# Altium footprint library 3D封装库.PcbLib: 716 footprints (part 18 of 45)
Each footprint in its own frame and in the unit in brackets; x right, y up, seen from the top. Pads: shape width x height; smd on the part's side, far side on the other; paste and mask are expansions set on the pad; w line width, h text height; cw(c..) or ccw(c..) is an arc to the next point about the centre after c.
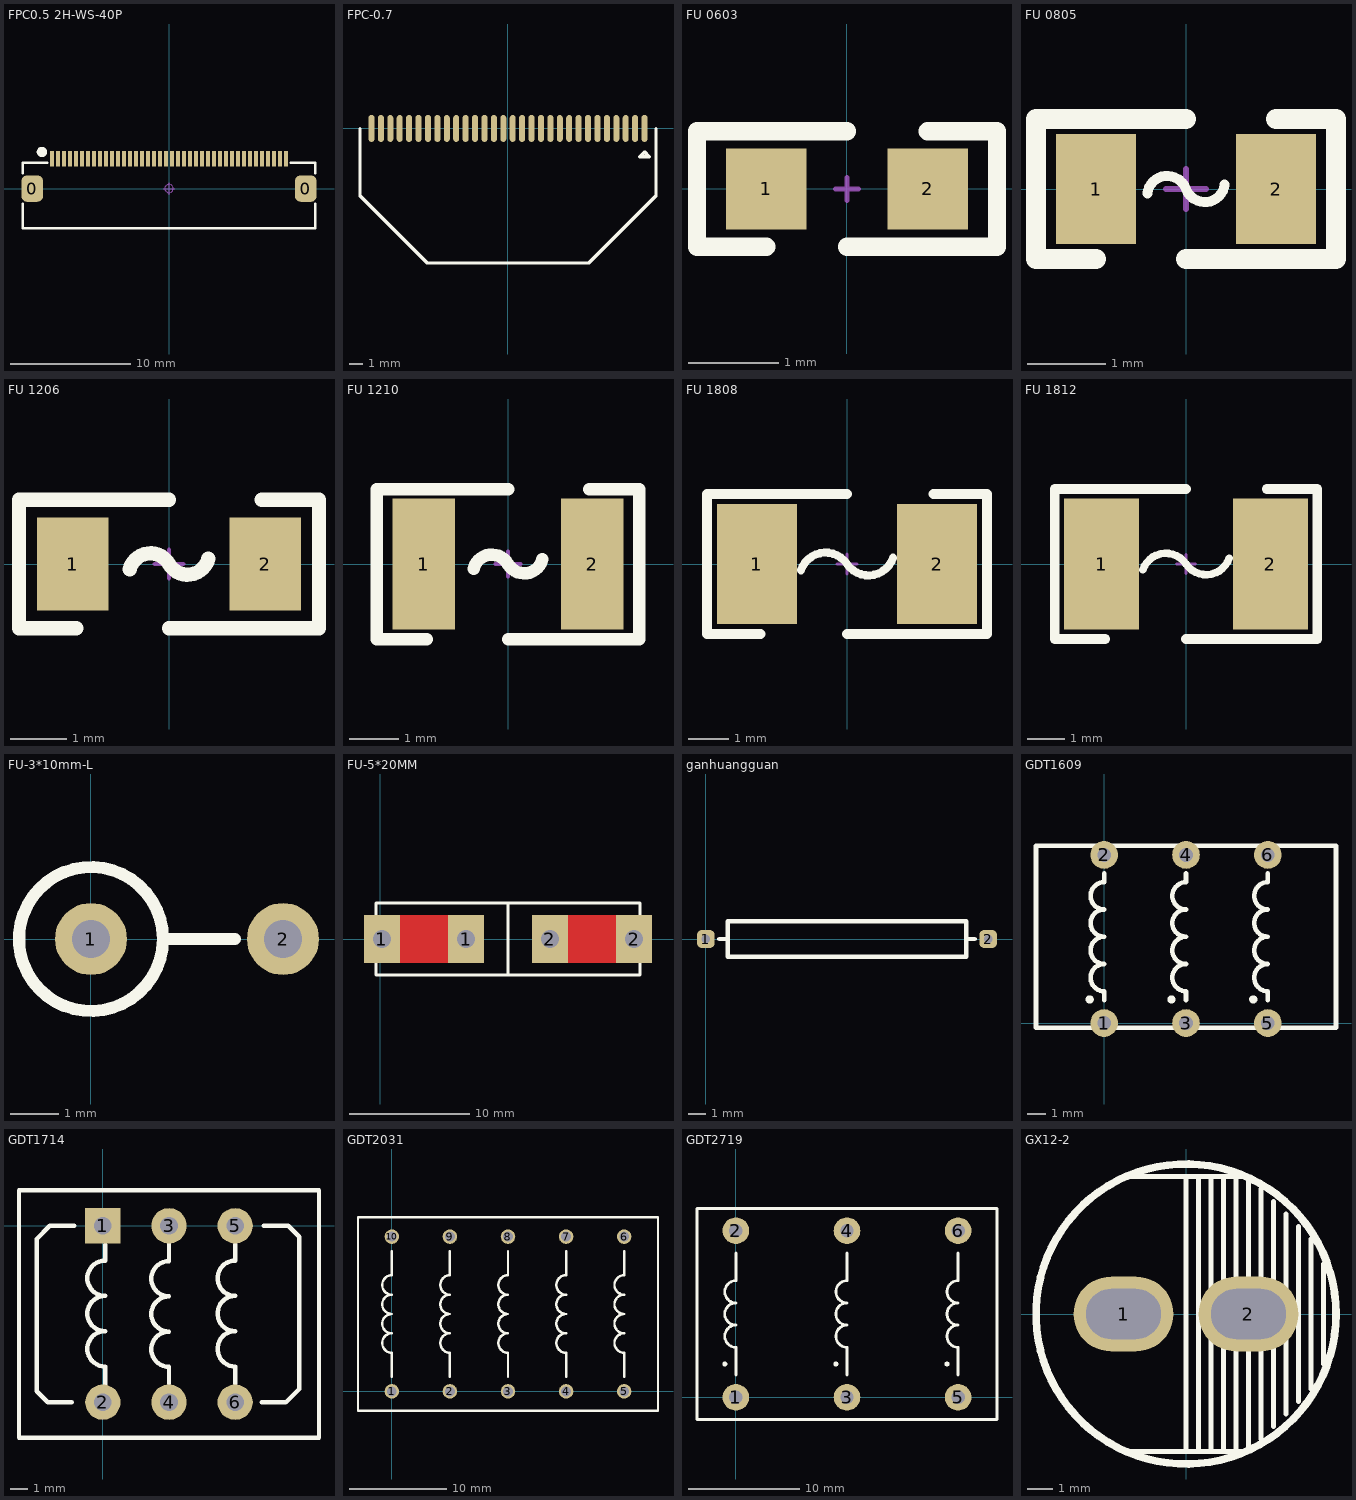
[diagram p17: the footprints below, top view; thin cyan lines are the x and y axes]

## FPC0.5 2H-WS-40P [mm] "长：24.2mm，宽：5.2mm，高：2mm"
pads (42):
  rrect50% 1.8x2.2 smd: 0(-11.4,0) 0(11.4,0)
  rect 0.3x1.3 smd: 1(-9.75,2.497) 2(-9.25,2.497) 3(-8.75,2.497) 4(-8.25,2.497) 5(-7.75,2.497) 6(-7.25,2.497) 7(-6.75,2.497) 8(-6.25,2.497) 9(-5.75,2.497) 10(-5.25,2.497) 11(-4.75,2.497) 12(-4.25,2.497) 13(-3.75,2.497) 14(-3.25,2.497) 15(-2.75,2.497) 16(-2.25,2.497) 17(-1.75,2.497) 18(-1.25,2.497) 19(-0.75,2.497) 20(-0.25,2.497) 21(0.25,2.497) 22(0.75,2.497) 23(1.25,2.497) 24(1.75,2.497) 25(2.25,2.497) 26(2.75,2.497) 27(3.25,2.497) 28(3.75,2.497) 29(4.25,2.497) 30(4.75,2.497) 31(5.25,2.497) 32(5.75,2.497) 33(6.25,2.497) 34(6.75,2.497) 35(7.25,2.497) 36(7.75,2.497) 37(8.25,2.497) 38(8.75,2.497) 39(9.25,2.497) 40(9.75,2.497)
Top Overlay:
  circle w0.5: c-10.594,3.048 r0.18
  lines w0.2: -12.175,-1.27 -12.175,-3.302 12.175,-3.302 12.175,-1.27 ; -12.175,1.27 -12.175,2.159 -10.143,2.159 ; 10.143,2.159 12.175,2.159 12.175,1.27
Mechanical 15:
  circle w0.05: c0,0 r0.35
  lines w0.05: -0.5,0 0.5,0 ; 0,-0.5 0,0.5
3D body "FPC0.5 2H-S-W-40P.STEP": height 2, standoff -0.01, extent -12.1,-3.15 12.1,2.85

## FPC-0.7 [mm] "0.96OLED"
pads (30):
  oval 0.45x2 smd: 1(10.15,0) 2(9.45,0) 3(8.75,0) 4(8.05,0) 5(7.35,0) 6(6.65,0) 7(5.95,0) 8(5.25,0) 9(4.55,0) 10(3.85,0) 11(3.15,0) 12(2.45,0) 13(1.75,0) 14(1.05,0) 15(0.35,0) 16(-0.35,0) 17(-1.05,0) 18(-1.75,0) 19(-2.45,0) 20(-3.15,0) 21(-3.85,0) 22(-4.55,0) 23(-5.25,0) 24(-5.95,0) 25(-6.65,0) 26(-7.35,0) 27(-8.05,0) 28(-8.75,0) 29(-9.45,0) 30(-10.15,0)
Top Overlay:
  lines w0.254: -11,0 -11,-5 -6,-10 6,-10 11,-5 11,0 ; 9.8,-2.1 10.5,-2.1 10.15,-1.75 9.8,-2.1

## FU 0603 [mil] "贴片保险丝"
pads (2):
  rect 35x35 smd: 1(-35,0) 2(35,0)
Top Overlay:
  lines w8: -35,-25 -65,-25 -65,25 -40,25 0,25 ; 0,-25 40,-25 65,-25 65,25 35,25
Mechanical 15:
  lines w2: -5,0 5,0 ; 0,-5 0,0 0,5
3D body "FU 0603.STEP": height 20.47, standoff 0, extent -31.5,-16.14 31.5,16.14

## FU 0805 [mil] "贴片保险丝"
pads (2):
  rect 40x55 smd: 1(-45,0) 2(45,0)
Top Overlay:
  lines w5: -19.33,-2.28 cw(c-9.4,-3.42) 0,0 ccw(c9.4,3.42) 19.33,2.28
  lines w10: -45,-35 -75,-35 -75,35 -45,35 0,35 ; 0,-35 60,-35 ; 45,35 75,35 75,-35 50,-35
Mechanical 15:
  lines w3: -10,0 10,0 ; 0,-10 0,10
3D body "FU 0805.STEP": height 20.47, standoff 0, extent -39.37,-24.02 39.37,24.02

## FU 1206 [mil] "贴片保险丝"
pads (2):
  rect 50x65 smd: 1(-67.5,0) 2(67.5,0)
Top Overlay:
  lines w10: -90,45 0,45 ; -65,-45 -105,-45 -105,45 -65,45 ; -27.48,-3.62 cw(c-12.99,-7.5) 0,0 ccw(c12.99,7.5) 27.48,3.62 ; 0,-45 90,-45 ; 65,-45 105,-45 105,45 65,45
Mechanical 15:
  lines w3: -10,0 10,0 ; 0,-10 0,10
3D body "FU 01206.STEP": height 34.25, standoff 0, extent -62.99,-31.89 62.99,31.89

## FU 1210 [mil] "贴片保险丝"
pads (2):
  rect 50x105 smd: 1(-67.5,0) 2(67.5,0)
Top Overlay:
  lines w10: -90,60 0,60 ; -65,-60 -105,-60 -105,60 -65,60 ; -27.48,-3.62 cw(c-12.99,-7.5) 0,0 ccw(c12.99,7.5) 27.48,3.62 ; 0,-60 90,-60 ; 65,-60 105,-60 105,60 65,60
Mechanical 15:
  lines w3: -10,0 10,0 ; 0,-10 0,10
3D body "FU 01210.STEP": height 34.25, standoff 0, extent -62.99,-50.39 62.99,50.39

## FU 1808 [mm] "贴片保险丝"
pads (2):
  rect 2x3 smd: 1(-2.25,0) 2(2.25,0)
Top Overlay:
  lines w0.203: -1.15,-0.156 cw(c-0.537,-0.362) 0,0 ccw(c0.537,0.362) 1.15,0.156
  lines w0.254: -2.159,-1.75 -3.5,-1.75 -3.5,1.75 0,1.75 ; 0,-1.75 3.5,-1.75 3.5,1.75 2.159,1.75
Mechanical 15:
  lines w0.076: -0.254,0 0.254,0 ; 0,-0.254 0,0.254
3D body "User Library-FUSE_NANO2.STEP": height 2.7, standoff 0, extent -3.05,-1.35 3.05,1.35

## FU 1812 [mm] "贴片保险丝"
pads (2):
  rect 2x3.5 smd: 1(-2.25,0) 2(2.25,0)
Top Overlay:
  lines w0.203: -1.15,-0.156 cw(c-0.537,-0.362) 0,0 ccw(c0.537,0.362) 1.15,0.156
  lines w0.254: -2.159,-2 -3.5,-2 -3.5,2 0,2 ; 0,-2 3.5,-2 3.5,2 2.159,2
Mechanical 15:
  lines w0.076: -0.254,0 0.254,0 ; 0,-0.254 0,0.254
3D body "FU 01812.STEP": height 0.87, standoff 0, extent -2.3,-1.61 2.3,1.61

## FU-3*10mm-L [mm]
pads (2):
  round 1.5 hole 0.8: 1(0,0) 2(4,0)
Top Overlay:
  circle w0.254: c0,0 r1.5
  lines w0.254: 1.5,0 3,0

## FU-5*20MM [mil]
pads (4):
  rect 118x157 hole 59: 1(5,0) 1(281,0) 2(556,0) 2(832,0)
Top Layer:
  region: 241,79 44,79 44,-79 241,-79
  region: 792,79 596,79 596,-79 792,-79
Bottom Layer:
  region: 241,79 44,79 44,-79 241,-79
  region: 792,79 596,79 596,-79 792,-79
Top Overlay:
  lines w10: 418,-118.11 418,118.11 ; -15,-118.11 851,-118.11 851,118.11 -15,118.11 -15,-118.11

## ganhuangguan [mm]
pads (2):
  rrect50% 1x1 hole 0.5: 1(0,0) 2(16,0)
Top Overlay:
  lines w0.254: 0.75,0 1.25,0 ; 15.25,0 14.75,0 ; 14.75,0 14.75,1 1.25,1 1.25,-1 14.75,-1 14.75,0

## GDT1609 [mil]
pads (6):
  round 60 hole 30: 1(0,0) 2(0,364.17) 3(177.17,0) 4(177.17,364.17) 5(354.33,0) 6(354.33,364.17)
Top Overlay:
  circle w10: c-31.5,51.18 r3.94
  circle w10: c145.67,51.18 r3.94
  circle w10: c322.83,51.18 r3.94
  lines w10: 0,49.21 0,68.9 cw(c0,98.43) 0,127.95 cw(c0,157.48) 0,187.01 cw(c0,216.54) 0,246.06 cw(c0,275.59) 0,305.12 0,324.8 ; 177.17,49.21 177.17,68.9 cw(c177.17,98.43) 177.17,127.95 cw(c177.17,157.48) 177.17,187.01 cw(c177.17,216.54) 177.17,246.06 cw(c177.17,275.59) 177.17,305.12 177.17,324.8 ; 354.33,49.21 354.33,68.9 cw(c354.33,98.43) 354.33,127.95 cw(c354.33,157.48) 354.33,187.01 cw(c354.33,216.54) 354.33,246.06 cw(c354.33,275.59) 354.33,305.12 354.33,324.8 ; -147.64,-9.84 501.97,-9.84 501.97,383.86 -147.64,383.86 -147.64,-9.84

## GDT1714 [mm]
pads (6):
  rect 2x2 hole 1: 1(0,0)
  round 2 hole 1: 2(0,-10) 3(3.75,0) 4(3.75,-10) 5(7.5,0) 6(7.5,-10)
Top Overlay:
  lines w0.254: -1.75,-10 -3.125,-10 -3.75,-9.375 -3.75,-0.75 -3,0 -1.625,0 ; 0.125,-9 0.125,-7.975 cw(c0.125,-6.975) 0.125,-5.975 cw(c0.125,-4.975) 0.125,-3.975 cw(c0.125,-2.975) 0.125,-1.975 0.125,-1.075 ; 3.75,-8.95 3.75,-8 cw(c3.75,-7) 3.75,-6 cw(c3.75,-5) 3.75,-4 cw(c3.75,-3) 3.75,-2 3.75,-1.025 ; 7.5,-8.95 7.5,-7.975 cw(c7.5,-6.975) 7.5,-5.975 cw(c7.5,-4.975) 7.5,-3.975 cw(c7.5,-2.975) 7.5,-1.975 7.5,-1.05 ; 9,-10 10.375,-10 11.125,-9.25 11.125,-0.625 10.5,0 9.125,0 ; -4.75,-12 12.25,-12 12.25,2 -4.75,2 -4.75,-12
  text "." at 6.275,-2 h2
  text "." at 2.35,-2 h2
  text "." at -1.575,-2 h2

## GDT2031 [mm]
pads (10):
  round 1.5 hole 1: 1(0,0) 2(6,0) 3(12,0) 4(18,0) 5(24,0) 6(24,16) 7(18,16) 8(12,16) 9(6,16) 10(0,16)
Top Overlay:
  lines w0.254: 0,1.5 0,4 cw(c0,5) 0,6 cw(c0,7) 0,8 cw(c0,9) 0,10 cw(c0,11) 0,12 0,14.5 ; 6,1.5 6,4 cw(c6,5) 6,6 cw(c6,7) 6,8 cw(c6,9) 6,10 cw(c6,11) 6,12 6,14.5 ; 12,1.5 12,4 cw(c12,5) 12,6 cw(c12,7) 12,8 cw(c12,9) 12,10 cw(c12,11) 12,12 12,14.5 ; 18,1.5 18,4 cw(c18,5) 18,6 cw(c18,7) 18,8 cw(c18,9) 18,10 cw(c18,11) 18,12 18,14.5 ; 24,1.5 24,4 cw(c24,5) 24,6 cw(c24,7) 24,8 cw(c24,9) 24,10 cw(c24,11) 24,12 24,14.5 ; -3.5,-2 -3.5,18 27.5,18 27.5,-2 -3.5,-2

## GDT2719 [mm]
pads (6):
  round 2.4 hole 1.2: 1(0,0) 2(0,15) 3(10,0) 4(10,15) 5(20,0) 6(20,15)
Top Overlay:
  circle w0.254: c19,3 r0.1
  circle w0.254: c9,3 r0.1
  circle w0.254: c-1,3 r0.1
  lines w0.254: 0,2 0,4.5 cw(c0,5.5) 0,6.5 cw(c0,7.5) 0,8.5 cw(c0,9.5) 0,10.5 0,13 ; 10,2 10,4.5 cw(c10,5.5) 10,6.5 cw(c10,7.5) 10,8.5 cw(c10,9.5) 10,10.5 10,13 ; 20,2 20,4.5 cw(c20,5.5) 20,6.5 cw(c20,7.5) 20,8.5 cw(c20,9.5) 20,10.5 20,13 ; -3.5,-2 23.5,-2 23.5,17 -3.5,17 -3.5,-2

## GX12-2 [mm]
pads (2):
  oval 4x3 hole 2 slot 3 at 0 deg: 1(-2.5,0) 2(2.5,0)
Top Overlay:
  circle w0.305: c0,0 r6
  lines w0.203: -2.5,-5.5 2.5,-5.5 2.5,5.5 -2.5,5.5 ; 0,-5.5 0,5.5 ; 0.5,-5.5 0.5,5.5 ; 1,-5.5 1,-5 1,5.5 ; 1.5,-5.5 1.5,5.5 ; 2,-5.5 2,5.5 ; 3,-5 3,5 ; 3.5,-4.5 3.5,4.5 ; 4,-4 4,4 ; 4.5,-3.5 4.5,3.5 ; 5,-3 5,3 ; 5.5,-2 5.5,2